# Altium footprint library PcbLib.PcbLib: 428 footprints (part 8 of 27)
Each footprint in its own frame and in the unit in brackets; x right, y up, seen from the top. Pads: shape width x height; smd on the part's side, far side on the other; paste and mask are expansions set on the pad; w line width, h text height; cw(c..) or ccw(c..) is an arc to the next point about the centre after c.
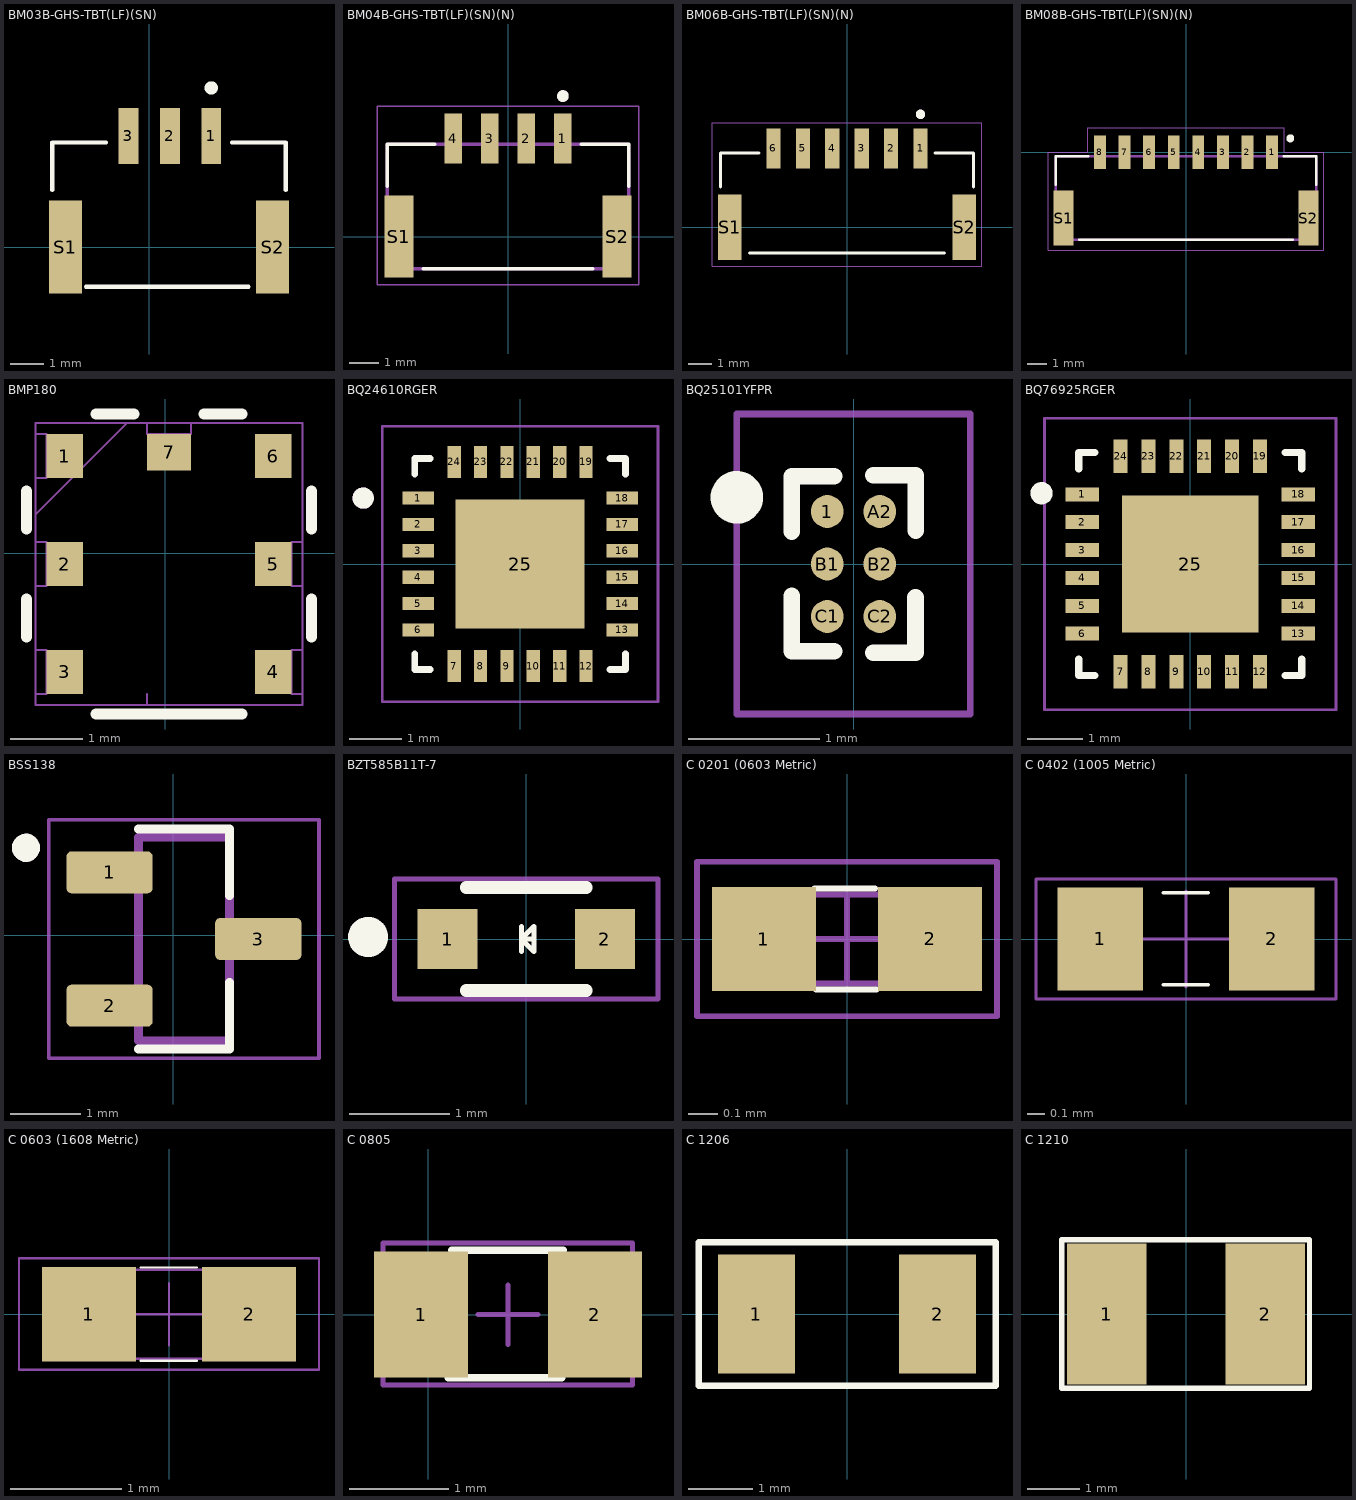
[diagram p7: the footprints below, top view; thin cyan lines are the x and y axes]

## BM03B-GHS-TBT(LF)(SN) [mm]
pads (5):
  rect 0.6x1.7 smd: 1(1.875,3.35) 2(0.625,3.35) 3(-0.625,3.35)
  rect 1x2.8 smd: S1(-2.525,0) S2(3.725,0)
Top Overlay:
  circle w0.2: c1.875,4.8 r0.1
  lines w0.127: -2.925,1.72 -2.925,3.15 -1.3,3.15 ; -1.9,-1.2 3,-1.2 ; 2.5,3.15 4.125,3.15 4.125,1.72
3D body "BM03B-GHS-TBT.STEP": height 4.25, standoff 0.05, extent -2.9,-1.125 4.1,3.825

## BM04B-GHS-TBT(LF)(SN)(N) [mm]
pads (6):
  rect 0.6x1.7 smd: 1(1.875,3.35) 2(0.625,3.35) 3(-0.625,3.35) 4(-1.875,3.35)
  rect 1x2.8 smd: S1(-3.725,0) S2(3.725,0)
Top Overlay:
  circle w0.2: c1.875,4.8 r0.1
  lines w0.127: -4.125,1.72 -4.125,3.15 -2.5,3.15 ; -2.9,-1.1 2.9,-1.1 ; 2.5,3.15 4.125,3.15 4.125,1.72
Mechanical 13:
  circle w0.2: c1.875,4.8 r0.1
  lines w0.127: -4.125,-1.1 4.125,-1.1 4.125,3.15 -4.125,3.15 -4.125,-1.1
Mechanical 15:
  lines w0.05: -4.475,-1.65 4.475,-1.65 4.475,4.45 -4.475,4.45 -4.475,-1.65
3D body "BM04B-GHS-TBT(LF)(SN)(N)--3DModel-STEP-46669.STEP": height 4.15, standoff 0, extent -4.123,-1.078 4.127,3.872

## BM06B-GHS-TBT(LF)(SN)(N) [mm]
pads (8):
  rect 0.6x1.7 smd: 1(3.125,3.35) 2(1.875,3.35) 3(0.625,3.35) 4(-0.625,3.35) 5(-1.875,3.35) 6(-3.125,3.35)
  rect 1x2.8 smd: S1(-4.975,0) S2(4.975,0)
Top Overlay:
  circle w0.2: c3.125,4.8 r0.1
  lines w0.127: -5.375,1.72 -5.375,3.15 -3.75,3.15 ; -4.15,-1.1 4.15,-1.1 ; 3.75,3.15 5.375,3.15 5.375,1.72
Mechanical 13:
  circle w0.2: c3.125,4.8 r0.1
Mechanical 15:
  lines w0.05: -5.725,-1.65 -5.725,4.45 5.725,4.45 5.725,-1.65 -5.725,-1.65
3D body "BM06B-GHS-TBT-LF--SN--N---3DModel-STEP-56544.STEP": height 4.2, standoff 0.05, extent -5.35,-1.084 5.4,3.866

## BM08B-GHS-TBT(LF)(SN)(N) [mm]
pads (10):
  rect 0.6x1.7 smd: 1(4.375,0) 2(3.125,0) 3(1.875,0) 4(0.625,0) 5(-0.625,0) 6(-1.875,0) 7(-3.125,0) 8(-4.375,0)
  rect 1x2.8 smd: S1(-6.225,-3.35) S2(6.225,-3.35)
Top Overlay:
  circle w0.2: c5.3,0.7 r0.1
  lines w0.127: -6.625,-1.65 -6.625,-0.2 -4.975,-0.2 ; -5.425,-4.45 5.425,-4.45 ; 4.975,-0.2 6.625,-0.2 6.625,-1.65
Mechanical 13:
  lines w0.127: -6.625,-4.45 6.625,-4.45 6.625,-0.2 -6.625,-0.2 -6.625,-4.45
Mechanical 15:
  lines w0.05: -7,-5 7,-5 7,0 5,0 5,1.25 -5,1.25 -5,0 -7,0 -7,-5
3D body "BM08B-GHS-TBT-LF--SN--N---3DModel-STEP-56544.STEP": height 4.15, standoff 0, extent -6.625,-4.445 6.625,0.505

## BMP180 [mil]
pads (7):
  rect 20x24 smd paste+0 mask+0: 1(-55,53) 2(-55,-6) 3(-55,-65) 4(59,-65) 5(59,-6) 6(59,53)
  rect 24x20 smd paste+0 mask+0: 7(2,55)
Top Overlay:
  lines w6: -76,-45.89 -76,-25.11 ; -76,13.11 -76,33.89 ; -37.89,-88 41.89,-88 ; -37.89,76 -17.11,76 ; 21.11,76 41.89,76 ; 80,-45.89 80,-25.11 ; 80,13.11 80,33.89
Mechanical 13:
  lines w1: -71,21 -21,71 ; -10,-77 -10,-83 14,-83 ; -71,-83 -71,71 75,71 75,-83 -71,-83 ; -71,-77 -65,-77 -65,-53 -71,-53 -71,-77 ; -71,-18 -65,-18 -65,6 -71,6 -71,-18 ; -71,41 -65,41 -65,65 -71,65 -71,41 ; -10,65 -10,71 14,71 14,65 -10,65 ; 69,-77 69,-53 75,-53 75,-77 69,-77 ; 69,-18 69,6 75,6 75,-18 69,-18
3D body "LGA7_3P6X3P8X0P93_BOS.step": height 39.09, standoff 0, extent -70.99,-83.01 74.99,71.01

## BQ24610RGER [mm]
pads (25):
  rect 0.6x0.25 smd: 1(-1.935,1.25) 2(-1.935,0.75) 3(-1.935,0.25) 4(-1.935,-0.25) 5(-1.935,-0.75) 6(-1.935,-1.25) 13(1.935,-1.25) 14(1.935,-0.75) 15(1.935,-0.25) 16(1.935,0.25) 17(1.935,0.75) 18(1.935,1.25)
  rect 0.25x0.6 smd: 7(-1.25,-1.935) 8(-0.75,-1.935) 9(-0.25,-1.935) 10(0.25,-1.935) 11(0.75,-1.935) 12(1.25,-1.935) 19(1.25,1.935) 20(0.75,1.935) 21(0.25,1.935) 22(-0.25,1.935) 23(-0.75,1.935) 24(-1.25,1.935)
  rect 2.45x2.45 smd paste-2: 25(0,0)
Top Overlay:
  circle w0.2: c-2.975,1.25 r0.1
  lines w0.127: -2,-1.705 -2,-2 -1.705,-2 ; -2,1.705 -2,2 -1.705,2 ; 1.705,-2 2,-2 2,-1.705 ; 1.705,2 2,2 2,1.705
Top Paste:
  region: 0.775,-0.775 -0.775,-0.775 -0.775,0.775 0.775,0.775
Mechanical 13:
  circle w0.2: c-2.975,1.25 r0.1
Mechanical 15:
  lines w0.05: -2.615,-2.615 -2.615,2.615 2.615,2.615 2.615,-2.615 -2.615,-2.615
3D body "step_temp.STEP": height 1, standoff 0, extent -2,-2 2,2

## BQ25101YFPR [mm]
pads (6):
  round 0.25 smd: 1(-0.2,0.4) A2(0.2,0.4) B1(-0.2,0) B2(0.2,0) C1(-0.2,-0.4) C2(0.2,-0.4)
Top Overlay:
  circle w0.2: c-0.889,0.508 r0.1
  lines w0.127: -0.47,-0.242 -0.47,-0.665 -0.147,-0.665 ; -0.47,0.247 -0.47,0.67 -0.147,0.67 ; 0.15,-0.677 0.473,-0.677 0.473,-0.254 ; 0.151,0.677 0.473,0.677 0.473,0.255
Mechanical 15:
  lines w0.05: -0.889,-1.143 0.889,-1.143 0.889,1.143 -0.889,1.143 -0.889,-1.143
3D body "BQ25100YFPR.STEP": height 0.5, standoff 0, extent -0.4,-0.6 0.4,0.6

## BQ76925RGER [mm]
pads (25):
  rect 0.6x0.25 smd: 1(-1.935,1.25) 2(-1.935,0.75) 3(-1.935,0.25) 4(-1.935,-0.25) 5(-1.935,-0.75) 6(-1.935,-1.25) 13(1.935,-1.25) 14(1.935,-0.75) 15(1.935,-0.25) 16(1.935,0.25) 17(1.935,0.75) 18(1.935,1.25)
  rect 0.25x0.6 smd: 7(-1.25,-1.935) 8(-0.75,-1.935) 9(-0.25,-1.935) 10(0.25,-1.935) 11(0.75,-1.935) 12(1.25,-1.935) 19(1.25,1.935) 20(0.75,1.935) 21(0.25,1.935) 22(-0.25,1.935) 23(-0.75,1.935) 24(-1.25,1.935)
  rect 2.45x2.45 smd paste-2: 25(0,0)
Top Overlay:
  circle w0.2: c-2.667,1.27 r0.1
  lines w0.127: -2,-1.705 -2,-2 -1.705,-2 ; -2,1.705 -2,2 -1.705,2 ; 1.705,-2 2,-2 2,-1.705 ; 1.705,2 2,2 2,1.705
Top Paste:
  region: -0.1,0.1 -1.18,0.1 -1.18,1.18 -0.1,1.18
  region: 1.18,0.1 0.1,0.1 0.1,1.18 1.18,1.18
  region: 1.18,-1.18 0.1,-1.18 0.1,-0.1 1.18,-0.1
  region: -0.1,-1.18 -1.18,-1.18 -1.18,-0.1 -0.1,-0.1
Mechanical 15:
  lines w0.05: -2.615,-2.615 2.615,-2.615 2.615,2.615 -2.615,2.615 -2.615,-2.615
3D body "step_temp.STEP": height 1, standoff 0, extent -2,-2 2,2

## BSS138 [mm]
pads (3):
  rrect25% 1.23x0.6 smd: 1(-0.908,0.899) 2(-0.908,-1.001) 3(1.212,-0.051)
Top Overlay:
  circle w0.2: c-2.098,1.249 r0.1
  lines w0.127: -0.498,-1.621 0.802,-1.621 0.802,-0.671 ; -0.498,1.519 0.802,1.519 0.802,0.569
Mechanical 13:
  circle w0.2: c-2.098,1.249 r0.1
  lines w0.127: -0.498,-1.501 -0.498,1.399 0.802,1.399 0.802,-1.501 -0.498,-1.501
Mechanical 15:
  lines w0.05: -1.773,-1.751 2.077,-1.751 2.077,1.649 -1.773,1.649 -1.773,-1.751
3D body "step_temp.STEP": height 1.11, standoff 0, extent -1.048,-1.501 1.352,1.399

## BZT585B11T-7 [mm]
pads (2):
  rect 0.6x0.6 smd: 1(-0.785,0) 2(0.785,0)
Top Overlay:
  circle w0.2: c-1.58,0.02 r0.1
  lines w0.05: -0.05,-0.125 -0.05,0.125 ; 0.075,0 -0.05,0 ; -0.05,0 0.075,0.125 0.075,-0.125 -0.05,0
  lines w0.127: -0.6,-0.515 0.6,-0.515 ; -0.6,0.515 0.6,0.515
Mechanical 15:
  lines w0.05: -1.315,-0.6 1.315,-0.6 1.315,0.6 -1.315,0.6 -1.315,-0.6
3D body "BZT585B11T-7.STEP": height 0.65, standoff 0, extent -0.8,-0.4 0.8,0.4

## C 0201 (0603 Metric) [mm]
pads (2):
  rect 0.35x0.35 smd paste+0 mask+0: 1(-0.28,0) 2(0.28,0)
Top Overlay:
  lines w0.02: -0.109,0.17 0.094,0.17 ; -0.104,-0.171 0.099,-0.17
Mechanical 13:
  lines w0.02: -0.3,-0.15 0.3,-0.15 0.3,0.15 -0.3,0.15 -0.3,-0.15
Mechanical 15:
  lines w0.02: -0.254,0 0.254,0 ; 0,-0.152 0,0.152 ; -0.505,-0.26 0.505,-0.26 0.505,0.26 -0.505,0.26 -0.505,-0.26
3D body "User Library-SMD CAPACITOR.STEP": height 0.3, standoff 0, extent -0.3,-0.15 0.3,0.15

## C 0402 (1005 Metric) [mm] "Chip Capacitor, Body 1.0x0.5mm, IPC High Density"
height 1.3
pads (2):
  rect 0.5x0.6 smd: 1(-0.5,0) 2(0.5,0)
Top Overlay:
  lines w0.02: -0.132,-0.267 0.13,-0.267 ; -0.132,0.271 0.13,0.271
Mechanical 15:
  lines w0.02: -0.3,0 0.3,0 ; 0,-0.279 0,0.279 ; -0.875,-0.35 0.875,-0.35 0.875,-0.175 0.875,0.175 0.875,0.35 0.437,0.35 -0.437,0.35 -0.875,0.35 -0.875,0.175 -0.875,-0.175 -0.875,-0.35
3D body "User Library-SMD CAPACITOR0402.STEP": height 0.52, standoff 0.02, extent -0.5,-0.25 0.5,0.25

## C 0603 (1608 Metric) [mm]
pads (2):
  rect 0.85x0.85 smd paste+0 mask+0: 1(-0.72,0) 2(0.72,0)
Top Overlay:
  lines w0.02: -0.257,-0.419 0.251,-0.419 ; -0.257,0.42 0.251,0.42
Mechanical 13:
  lines w0.02: -0.8,-0.4 -0.8,0.4 0.8,0.4 0.8,-0.4 -0.8,-0.4
Mechanical 15:
  lines w0.02: -0.3,0 0.3,0 ; 0,-0.279 0,0.279 ; -1.35,-0.5 -1.35,0.505 1.35,0.505 1.35,-0.5 -1.35,-0.5
3D body "User Library-SMD CAPACITOR0603.STEP": height 0.82, standoff 0.02, extent -0.8,-0.4 0.8,0.4

## C 0805 [mm]
pads (2):
  rect 0.95x1.27 smd: 1(-0.074,0) 2(1.679,0)
Top Overlay:
  lines w0.076: 0.203,-0.635 1.346,-0.635 ; 0.234,0.648 1.359,0.648
Mechanical 15:
  lines w0.051: 0.503,0 1.103,0 ; 0.803,-0.3 0.803,0.3 ; -0.457,-0.711 -0.457,0.724 2.057,0.724 2.057,-0.711 -0.457,-0.711
3D body "User Library-cap_0805-1.STEP": height 1.2, standoff 0, extent -0.187,-0.6 1.813,0.6

## C 1206 [mm]
pads (2):
  rect 1.2x1.85 smd: 1(-1.41,0) 2(1.41,0)
Top Overlay:
  lines w0.1: -2.308,-1.112 -2.308,1.116 2.317,1.116 2.317,-1.112 -2.308,-1.112
3D body "User Library-Vhip cap 1206.step": height 1.77, standoff 0.03, extent -1.625,-0.842 1.575,0.858

## C 1210 [mm]
pads (2):
  rect 1.52x2.7 smd: 1(-1.525,0) 2(1.515,0)
Top Overlay:
  lines w0.1: -2.381,-1.417 -2.381,1.42 2.358,1.42 2.358,-1.417 -2.381,-1.417
3D body "User Library-CAPC3225X178N.step": height 1.89, standoff -0.01, extent -1.672,-1.305 1.654,1.293